# Altium footprint library Reflow3D1411sep.PcbLib: 657 footprints (part 9 of 42)
Each footprint in its own frame and in the unit in brackets; x right, y up, seen from the top. Pads: shape width x height; smd on the part's side, far side on the other; paste and mask are expansions set on the pad; w line width, h text height; cw(c..) or ccw(c..) is an arc to the next point about the centre after c.
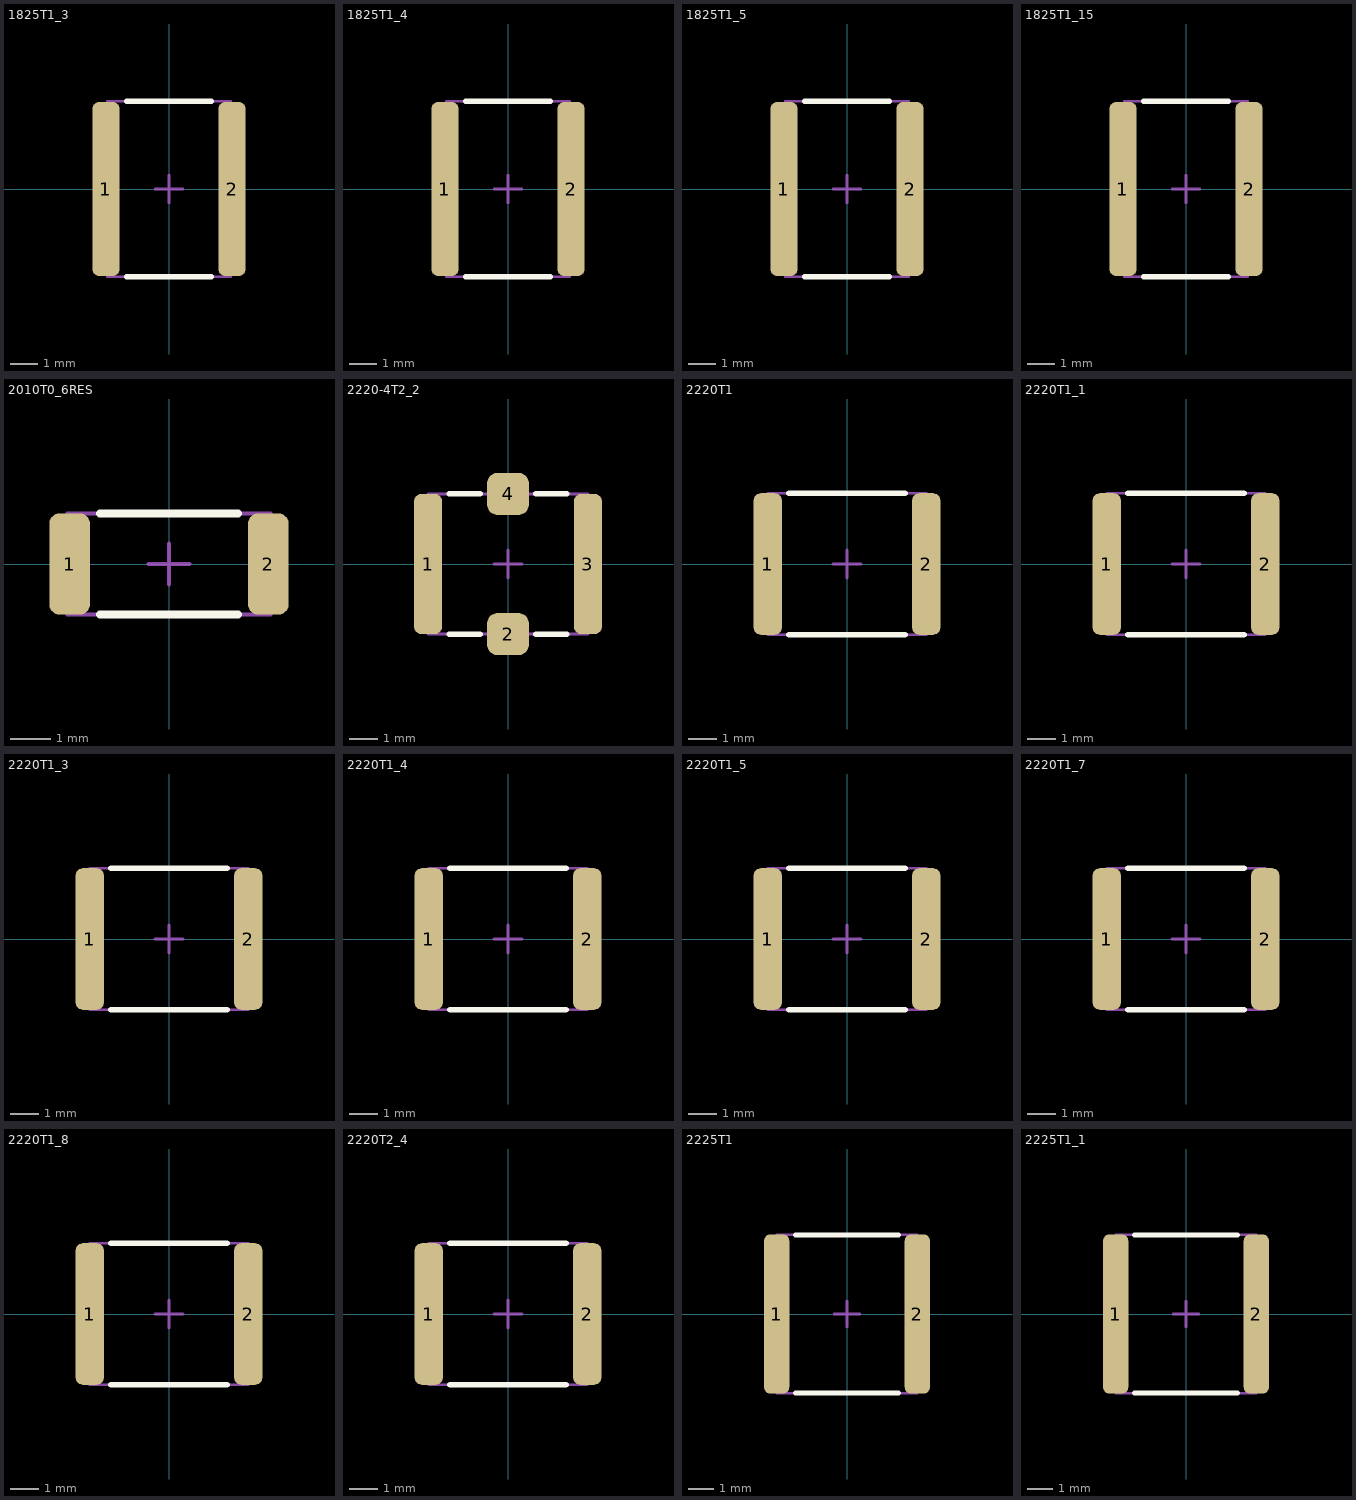
[diagram p8: the footprints below, top view; thin cyan lines are the x and y axes]

## 1825T1_3 [mm] "www.avx.com, smccp.pdf; www.kemet.com, F3102_C0G.pdf"
height 1.3
pads (2):
  rrect50% 1x6.35 smd mask+0.075: 1(-2.3,0) 2(2.3,0)
Top Overlay:
  lines w0.2: -1.55,-3.2 1.55,-3.2 ; -1.55,3.2 1.55,3.2
Mechanical 13:
  lines w0.1: -2.25,-3.2 -2.25,3.2 2.25,3.2 2.25,-3.2 -2.25,-3.2
Mechanical 15:
  lines w0.1: -0.5,0 0.5,0 ; 0,-0.5 0,0.5
3D body: height 1.45, standoff 0, extent -2.4,-3.4 2.4,3.4

## 1825T1_4 [mm] "www.avx.com, smccp.pdf; www.kemet.com, F3102_C0G.pdf"
height 1.4
pads (2):
  rrect50% 1x6.35 smd mask+0.075: 1(-2.3,0) 2(2.3,0)
Top Overlay:
  lines w0.2: -1.55,-3.2 1.55,-3.2 ; -1.55,3.2 1.55,3.2
Mechanical 13:
  lines w0.1: -2.25,-3.2 -2.25,3.2 2.25,3.2 2.25,-3.2 -2.25,-3.2
Mechanical 15:
  lines w0.1: -0.5,0 0.5,0 ; 0,-0.5 0,0.5
3D body: height 1.55, standoff 0, extent -2.4,-3.4 2.4,3.4

## 1825T1_5 [mm] "www.avx.com, smccp.pdf; www.kemet.com, F3102_C0G.pdf"
height 1.5
pads (2):
  rrect50% 1x6.35 smd mask+0.075: 1(-2.3,0) 2(2.3,0)
Top Overlay:
  lines w0.2: -1.55,-3.2 1.55,-3.2 ; -1.55,3.2 1.55,3.2
Mechanical 13:
  lines w0.1: -2.25,-3.2 -2.25,3.2 2.25,3.2 2.25,-3.2 -2.25,-3.2
Mechanical 15:
  lines w0.1: -0.5,0 0.5,0 ; 0,-0.5 0,0.5
3D body: height 1.65, standoff 0, extent -2.4,-3.4 2.4,3.4

## 1825T1_15 [mm] "www.avx.com, smccp.pdf; www.kemet.com, F3102_C0G.pdf"
height 1.15
pads (2):
  rrect50% 1x6.35 smd mask+0.075: 1(-2.3,0) 2(2.3,0)
Top Overlay:
  lines w0.2: -1.55,-3.2 1.55,-3.2 ; -1.55,3.2 1.55,3.2
Mechanical 13:
  lines w0.1: -2.25,-3.2 2.25,-3.2 2.25,3.2 -2.25,3.2 -2.25,-3.2
Mechanical 15:
  lines w0.1: -0.5,0 0.5,0 ; 0,-0.5 0,0.5
3D body: height 1.3, standoff 0, extent -2.4,-3.4 2.4,3.4

## 2010T0_6RES [mm] "www.vishay.com, dcrcwe3.pdf"
height 0.6
pads (2):
  rrect50% 1x2.5 smd mask+0.075: 1(-2.45,0) 2(2.45,0)
Top Overlay:
  lines w0.2: -1.7,-1.25 1.7,-1.25 ; -1.7,1.25 1.7,1.25
Mechanical 13:
  lines w0.1: -2.5,-1.25 2.5,-1.25 2.5,1.25 -2.5,1.25 -2.5,-1.25
Mechanical 15:
  lines w0.1: -0.5,0 0.5,0 ; 0,-0.5 0,0.5
3D body: height 0.7, standoff 0, extent -2.575,-1.325 2.575,1.325

## 2220-4T2_2 [mm] "www.murata.com, c31e.pdf, NFM55P"
height 2.2
pads (4):
  rrect50% 1x5 smd mask+0.075: 1(-2.85,0) 3(2.85,0)
  rrect50% 1.5x1.5 smd mask+0.075: 2(0,-2.5) 4(0,2.5)
Top Overlay:
  lines w0.2: -2.1,-2.5 -1,-2.5 ; -2.1,2.5 -1,2.5 ; 1,-2.5 2.1,-2.5 ; 1,2.5 2.1,2.5
Mechanical 13:
  lines w0.1: -2.85,-2.5 2.85,-2.5 2.85,2.5 -2.85,2.5 -2.85,-2.5
Mechanical 15:
  lines w0.1: -0.5,0 0.5,0 ; 0,-0.5 0,0.5
3D body: height 2.5, standoff 0, extent -3,-2.65 3,2.65

## 2220T1 [mm] "www.avx.com, smccp.pdf; www.kemet.com, F3102_C0G.pdf"
height 1
pads (2):
  rrect50% 1x5 smd mask+0.075: 1(-2.8,0) 2(2.8,0)
Top Overlay:
  lines w0.2: -2.05,-2.5 2.05,-2.5 ; -2.05,2.5 2.05,2.5
Mechanical 13:
  lines w0.1: -2.8,-2.5 -2.8,2.5 2.8,2.5 2.8,-2.5 -2.8,-2.5
Mechanical 15:
  lines w0.1: -0.5,0 0.5,0 ; 0,-0.5 0,0.5
3D body: height 1.15, standoff 0, extent -3,-2.7 3,2.7

## 2220T1_1 [mm] "www.avx.com, smccp.pdf; www.kemet.com, F3102_C0G.pdf"
height 1.1
pads (2):
  rrect50% 1x5 smd mask+0.075: 1(-2.8,0) 2(2.8,0)
Top Overlay:
  lines w0.2: -2.05,-2.5 2.05,-2.5 ; -2.05,2.5 2.05,2.5
Mechanical 13:
  lines w0.1: -2.8,-2.5 -2.8,2.5 2.8,2.5 2.8,-2.5 -2.8,-2.5
Mechanical 15:
  lines w0.1: -0.5,0 0.5,0 ; 0,-0.5 0,0.5
3D body: height 1.25, standoff 0, extent -3,-2.7 3,2.7

## 2220T1_3 [mm] "www.avx.com, smccp.pdf; www.kemet.com, F3102_C0G.pdf"
height 1.3
pads (2):
  rrect50% 1x5 smd mask+0.075: 1(-2.8,0) 2(2.8,0)
Top Overlay:
  lines w0.2: -2.05,-2.5 2.05,-2.5 ; -2.05,2.5 2.05,2.5
Mechanical 13:
  lines w0.1: -2.8,-2.5 -2.8,2.5 2.8,2.5 2.8,-2.5 -2.8,-2.5
Mechanical 15:
  lines w0.1: -0.5,0 0.5,0 ; 0,-0.5 0,0.5
3D body: height 1.45, standoff 0, extent -3,-2.7 3,2.7

## 2220T1_4 [mm] "www.avx.com, smccp.pdf; www.kemet.com, F3102_C0G.pdf"
height 1.4
pads (2):
  rrect50% 1x5 smd mask+0.075: 1(-2.8,0) 2(2.8,0)
Top Overlay:
  lines w0.2: -2.05,-2.5 2.05,-2.5 ; -2.05,2.5 2.05,2.5
Mechanical 13:
  lines w0.1: -2.8,-2.5 2.8,-2.5 2.8,2.5 -2.8,2.5 -2.8,-2.5
Mechanical 15:
  lines w0.1: -0.5,0 0.5,0 ; 0,-0.5 0,0.5
3D body: height 1.55, standoff 0, extent -3,-2.7 3,2.7

## 2220T1_5 [mm] "www.avx.com, smccp.pdf; www.kemet.com, F3102_C0G.pdf"
height 1.5
pads (2):
  rrect50% 1x5 smd mask+0.075: 1(-2.8,0) 2(2.8,0)
Top Overlay:
  lines w0.2: -2.05,-2.5 2.05,-2.5 ; -2.05,2.5 2.05,2.5
Mechanical 13:
  lines w0.1: -2.8,-2.5 2.8,-2.5 2.8,2.5 -2.8,2.5 -2.8,-2.5
Mechanical 15:
  lines w0.1: -0.5,0 0.5,0 ; 0,-0.5 0,0.5
3D body: height 1.65, standoff 0, extent -3,-2.7 3,2.7

## 2220T1_7 [mm] "www.avx.com, smccp.pdf; www.kemet.com, F3102_C0G.pdf"
height 1.7
pads (2):
  rrect50% 1x5 smd mask+0.075: 1(-2.8,0) 2(2.8,0)
Top Overlay:
  lines w0.2: -2.05,-2.5 2.05,-2.5 ; -2.05,2.5 2.05,2.5
Mechanical 13:
  lines w0.1: -2.8,-2.5 -2.8,2.5 2.8,2.5 2.8,-2.5 -2.8,-2.5
Mechanical 15:
  lines w0.1: -0.5,0 0.5,0 ; 0,-0.5 0,0.5
3D body: height 1.85, standoff 0, extent -3,-2.7 3,2.7

## 2220T1_8 [mm] "www.avx.com, smccp.pdf; www.kemet.com, F3102_C0G.pdf"
height 1.8
pads (2):
  rrect50% 1x5 smd mask+0.075: 1(-2.8,0) 2(2.8,0)
Top Overlay:
  lines w0.2: -2.05,-2.5 2.05,-2.5 ; -2.05,2.5 2.05,2.5
Mechanical 13:
  lines w0.1: -2.8,-2.5 -2.8,2.5 2.8,2.5 2.8,-2.5 -2.8,-2.5
Mechanical 15:
  lines w0.1: -0.5,0 0.5,0 ; 0,-0.5 0,0.5
3D body: height 1.95, standoff 0, extent -3,-2.7 3,2.7

## 2220T2_4 [mm] "www.avx.com, smccp.pdf; www.kemet.com, F3102_C0G.pdf"
height 2.4
pads (2):
  rrect50% 1x5 smd mask+0.075: 1(-2.8,0) 2(2.8,0)
Top Overlay:
  lines w0.2: -2.05,-2.5 2.05,-2.5 ; -2.05,2.5 2.05,2.5
Mechanical 13:
  lines w0.1: -2.8,-2.5 -2.8,2.5 2.8,2.5 2.8,-2.5 -2.8,-2.5
Mechanical 15:
  lines w0.1: -0.5,0 0.5,0 ; 0,-0.5 0,0.5
3D body: height 2.55, standoff 0, extent -3,-2.7 3,2.7

## 2225T1 [mm] "www.avx.com, smccp.pdf; www.kemet.com, F3102_C0G.pdf"
height 1
pads (2):
  rrect50% 1x6.35 smd mask+0.075: 1(-2.8,0) 2(2.8,0)
Top Overlay:
  lines w0.2: -2.05,-3.15 2.05,-3.15 ; -2.05,3.15 2.05,3.15
Mechanical 13:
  lines w0.1: -2.8,-3.15 2.8,-3.15 2.8,3.15 -2.8,3.15 -2.8,-3.15
Mechanical 15:
  lines w0.1: -0.5,0 0.5,0 ; 0,-0.5 0,0.5
3D body: height 1.15, standoff 0, extent -3,-3.35 3,3.35

## 2225T1_1 [mm] "www.avx.com, smccp.pdf; www.kemet.com, F3102_C0G.pdf"
height 1.1
pads (2):
  rrect50% 1x6.35 smd mask+0.075: 1(-2.8,0) 2(2.8,0)
Top Overlay:
  lines w0.2: -2.05,-3.15 2.05,-3.15 ; -2.05,3.15 2.05,3.15
Mechanical 13:
  lines w0.1: -2.8,-3.15 -2.8,3.15 2.8,3.15 2.8,-3.15 -2.8,-3.15
Mechanical 15:
  lines w0.1: -0.5,0 0.5,0 ; 0,-0.5 0,0.5
3D body: height 1.25, standoff 0, extent -3,-3.35 3,3.35